# Altium footprint library PCB Library.PcbLib: 32 footprints (part 2 of 2)
Each footprint in its own frame and in the unit in brackets; x right, y up, seen from the top. Pads: shape width x height; smd on the part's side, far side on the other; paste and mask are expansions set on the pad; w line width, h text height; cw(c..) or ccw(c..) is an arc to the next point about the centre after c.
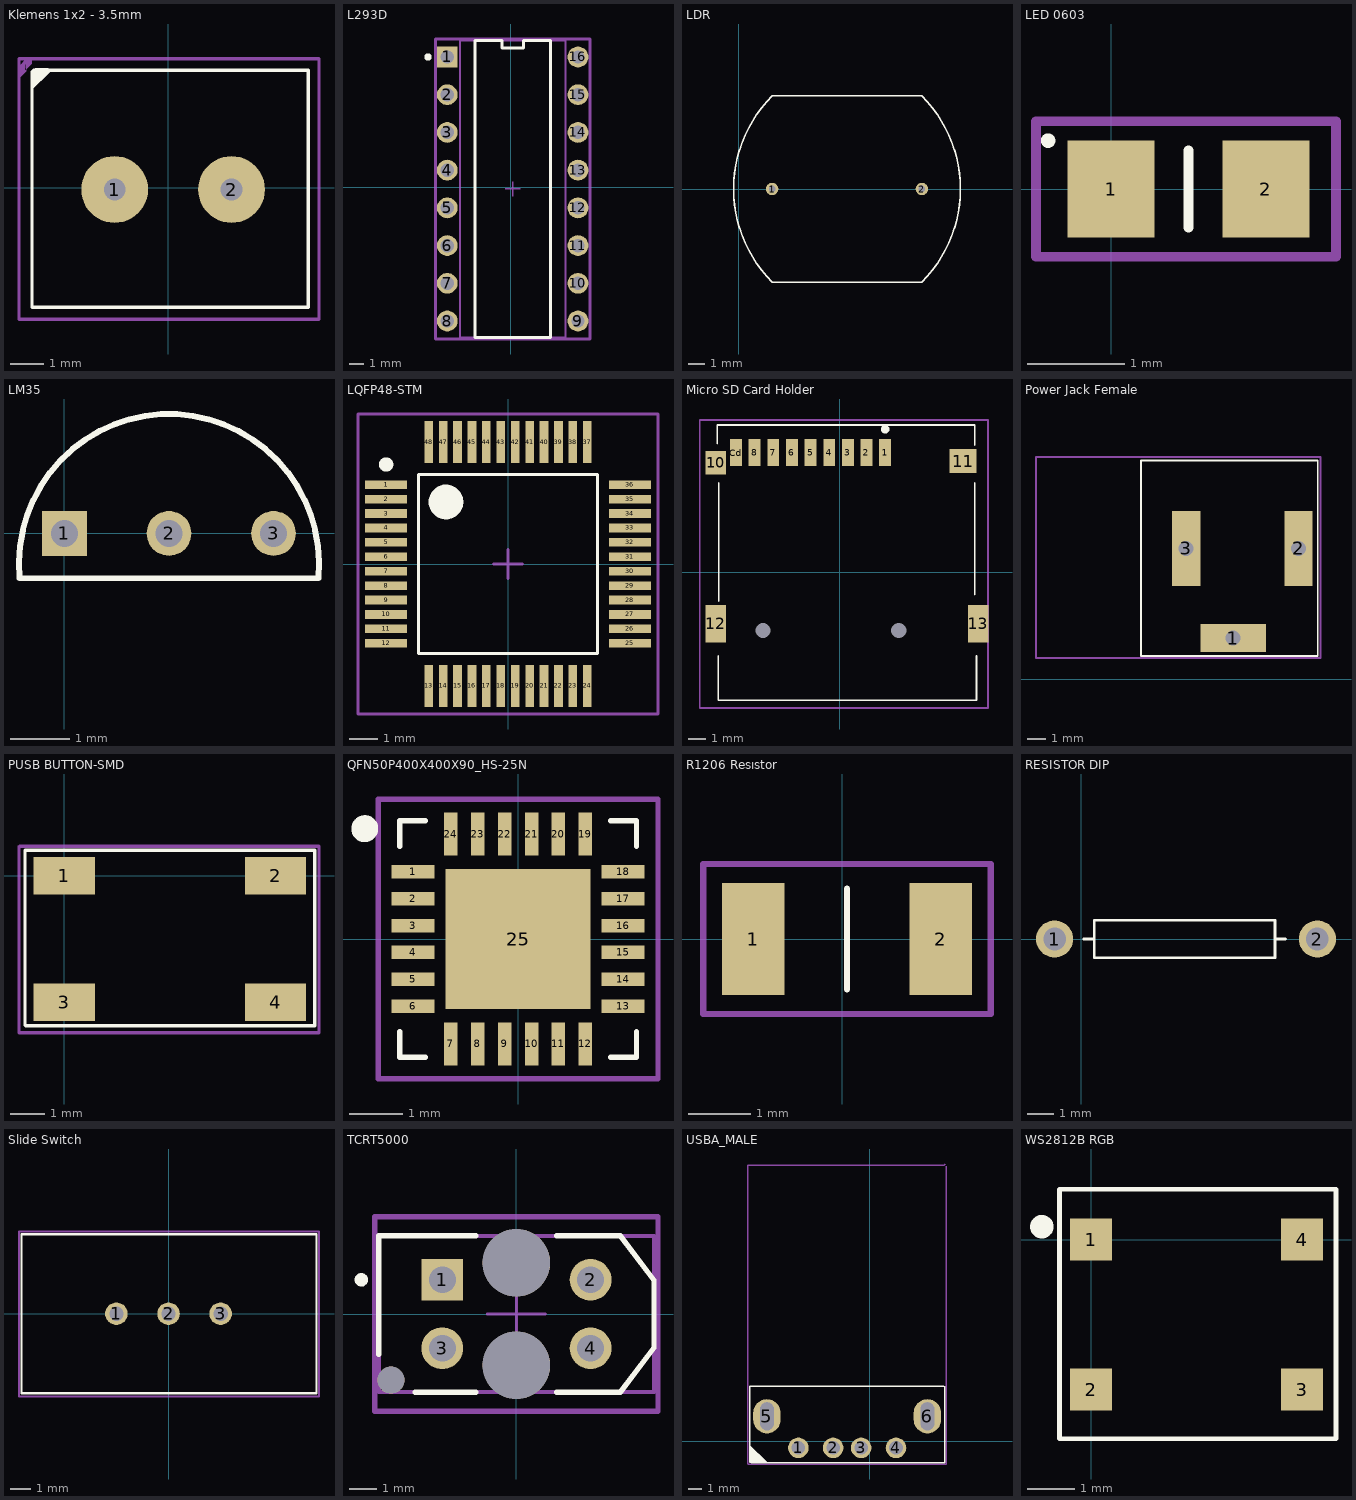
[diagram p1: the footprints below, top view; thin cyan lines are the x and y axes]

## Klemens 1x2 - 3.5mm [mm]
pads (2):
  round 2 hole 0.65: 1(-1.6,-0.05) 2(1.9,-0.05)
Top Overlay:
  region: -3.533,3.482 -4.106,2.909 -4.106,3.444 -3.972,3.577 -3.593,3.577
  lines w0.1: -4.075,3.475 -4.075,-3.575 4.2,-3.575 4.2,3.525 -4.025,3.525
Mechanical 3:
  region: -4.248,3.86 -4.464,3.644 -4.464,3.861 -4.462,3.86 -4.248,3.86 -4.248,3.496 -4.462,3.282 -4.462,3.86 -4.248,3.86 -4.241,3.853 -4.082,3.853 -4.082,3.709 -4.285,3.507
  lines w0.1: -4.462,-3.922 -4.462,3.86 -4.248,3.86 4.517,3.86 4.517,-3.931 -4.453,-3.931 -4.462,-3.922
3D body "terminal_blocks_a-tb350-te02.stp": height 8.9, standoff -3.29, extent -3.9,-3.45 4.094,3.55

## L293D [mm] "L293D Motor Driver"
pads (16):
  rect 1.4x1.4 hole 0.9 paste-1000 mask+0: 1(-4.256,8.78)
  round 1.4 hole 0.9 paste-1000 mask+0: 2(-4.256,6.24) 3(-4.256,3.7) 4(-4.256,1.16) 5(-4.256,-1.38) 6(-4.256,-3.92) 7(-4.256,-6.46) 8(-4.256,-9) 9(4.544,-9) 10(4.544,-6.46) 11(4.544,-3.92) 12(4.544,-1.38) 13(4.544,1.16) 14(4.544,3.7) 15(4.544,6.24) 16(4.544,8.78)
Top Overlay:
  circle w0.25: c-5.556,8.78 r0.125
  lines w0.2: -2.406,-10.11 2.694,-10.11 2.694,9.89 0.873,9.89 0.873,9.39 -0.585,9.39 -0.585,9.89 -2.406,9.89 -2.406,-10.11
Mechanical 3:
  lines w0.2: -5.056,-10.21 5.344,-10.21 5.344,9.99 -5.056,9.99 -5.056,-10.21
Mechanical 10:
  lines w0.2: -5.056,-10.21 -5.056,9.99 5.344,9.99 5.344,-10.21 -5.056,-10.21
Mechanical 12:
  lines w0.15: -3.406,-10.11 -3.406,9.89 3.694,9.89 3.694,-10.11 -3.406,-10.11
Mechanical 15:
  lines w0.1: -0.356,-0.11 0.644,-0.11 ; 0.144,-0.61 0.144,0.39
3D body "l293d.stp": height 6.82, standoff -1.56, extent -4.392,-9.856 4.842,9.575

## LDR [mm]
pads (2):
  round 0.75 hole 0.4 mask+0.051: 1(2,0) 2(11,0)
Top Overlay:
  lines w0.1: 2,-5.6 cw(c7.6,0) 2,5.6 11,5.6 cw(c5.4,0) 11,-5.6 2,-5.6
3D body "User Library-LDR12mm.step": height 3.7, standoff -4, extent 0.5,-5.467 12.5,5.452

## LED 0603 [mm]
pads (2):
  rect 0.9x1 smd: 1(0,0) 2(1.6,0)
Top Overlay:
  circle w0.1: c-0.65,0.5 r0.025
  lines w0.1: 0.8,-0.4 0.8,0.4
Mechanical 3:
  lines w0.1: -0.775,-0.7 -0.775,0.7 2.325,0.7 2.325,-0.7 -0.775,-0.7
3D body "ALSRobot-LED0603(G).step": height 0.6, standoff 0, extent -0.11,-0.4 1.51,0.4

## LM35 [mm] "LM35 Sıcaklık Sensörü"
pads (3):
  rect 0.75x0.75 hole 0.45 mask+0.051: 1(0,0)
  round 0.75 hole 0.45 mask+0.051: 2(1.75,0) 3(3.5,0)
Top Overlay:
  lines w0.1: -0.75,-0.75 cw(c1.75,-0.511) 4.25,-0.75 -0.75,-0.75
3D body "sensor_tsic501fto92.stp": height 3, standoff -14.3, extent -0.535,-0.75 4.035,1.55

## LQFP48-STM [mm] "TSQFP, 48-Leads, Body 7,00x7,00mm, Pitch 0,50mm, IPC Medium Density"
height 1.6
pads (48):
  rect 1.45x0.3 smd mask+0.05: 1(-4.225,2.75) 2(-4.225,2.25) 3(-4.225,1.75) 4(-4.225,1.25) 5(-4.225,0.75) 6(-4.225,0.25) 7(-4.225,-0.25) 8(-4.225,-0.75) 9(-4.225,-1.25) 10(-4.225,-1.75) 11(-4.225,-2.25) 12(-4.225,-2.75) 25(4.225,-2.75) 26(4.225,-2.25) 27(4.225,-1.75) 28(4.225,-1.25) 29(4.225,-0.75) 30(4.225,-0.25) 31(4.225,0.25) 32(4.225,0.75) 33(4.225,1.25) 34(4.225,1.75) 35(4.225,2.25) 36(4.225,2.75)
  rect 0.3x1.45 smd mask+0.05: 13(-2.75,-4.225) 14(-2.25,-4.225) 15(-1.75,-4.225) 16(-1.25,-4.225) 17(-0.75,-4.225) 18(-0.25,-4.225) 19(0.25,-4.225) 20(0.75,-4.225) 21(1.25,-4.225) 22(1.75,-4.225) 23(2.25,-4.225) 24(2.75,-4.225) 37(2.75,4.225) 38(2.25,4.225) 39(1.75,4.225) 40(1.25,4.225) 41(0.75,4.225) 42(0.25,4.225) 43(-0.25,4.225) 44(-0.75,4.225) 45(-1.25,4.225) 46(-1.75,4.225) 47(-2.25,4.225) 48(-2.75,4.225)
Top Overlay:
  circle w0.25: c-4.225,3.45 r0.125
  circle w0.6: c-2.15,2.15 r0.3
  lines w0.1: -3.1,-3.1 -3.1,3.1 3.1,3.1 3.1,-3.1 -3.1,-3.1
Mechanical 3:
  lines w0.1: -0.5,0 0.5,0 ; 0,-0.5 0,0.5 ; -5.2,-5.2 -5.2,5.2 5.2,5.2 5.2,-5.2 -5.2,-5.2
3D body "LQFP48-STM.step": height 1.6, standoff 0, extent -4.5,-4.5 4.5,4.5

## Micro SD Card Holder [mm]
pads (15):
  rect 0.7x1.6 smd paste+0 mask+0: 1(2.684,7.075) 2(1.584,7.075) 3(0.484,7.075) 4(-0.616,7.075) 5(-1.716,7.075) 6(-2.816,7.075) 7(-3.916,7.075) 8(-5.016,7.075) Cd(-6.116,7.075)
  rect 1.2x1.4 smd paste+0 mask+0: 10(-7.316,6.475)
  rect 1.6x1.4 smd paste+0 mask+0: 11(7.284,6.575)
  rect 1.2x2.2 smd paste+0 mask+0: 12(-7.316,-3.025) 13(8.184,-3.025)
  round 0 hole 0.9 unplated paste-1000 mask+0: ""(-4.516,-3.425) ""(3.484,-3.425)
Top Overlay:
  circle w0.25: c2.684,8.45 r0.125
  lines w0.1: -7.225,7.6 -7.225,8.7 7.975,8.7 7.975,7.5 ; -7.157,-4.925 -7.157,-7.548 8.075,-7.548 8.075,-4.925 ; -7.125,-1.7 -7.125,5.3 ; 7.975,-1.3 7.975,5.3
Mechanical 3:
  lines w0.1: -8.25,-8 -8.25,9 -7.75,9 8.5,9 8.75,9 8.75,-8 -8.25,-8
3D body "User Library-MEM2055-00-190-01-A_revG.step": height 1.85, standoff -0.6, extent -7.567,-7.42 8.433,7.83

## Power Jack Female [mm]
pads (3):
  rect 3.5x1.5 hole 0.8 square mask+0.051: 1(-11.5,2.2)
  rect 1.5x4 hole 0.8 square mask+0.051: 2(-8,7) 3(-14,7)
Top Overlay:
  lines w0.1: -16.425,1.25 -6.975,1.25 -6.975,11.7 -16.425,11.7 -16.425,1.25
Mechanical 3:
  lines w0.1: -6.825,1.15 -6.975,1.15 -22.025,1.15 -22.025,11.875 -6.925,11.875 -6.825,11.875 -6.825,1.2
3D body "dc-005-5a-20.stp": height 11.5, standoff -3.1, extent -21.9,1.85 -7.9,11.25

## PUSB BUTTON-SMD [mm]
pads (4):
  rect 1.8x1.1 smd mask+0.05: 1(0,0) 2(6.2,0) 3(0,-3.7) 4(6.2,-3.7)
Top Overlay:
  lines w0.1: -1.15,-4.375 -1.15,0.75 7.35,0.75 7.35,-4.4 -1.125,-4.4
Mechanical 3:
  lines w0.1: -1.325,-4.6 -1.325,0.85 -1.3,0.875 7.475,0.875 7.475,-4.6 -1.325,-4.6
3D body "User Library-4x4_SMD_Switch.step": height 1.5, standoff 0, extent -0.2,-4.5 6.2,0.7

## QFN50P400X400X90_HS-25N [mm] "QFN, 24-Leads, Body 4,00x4,00mm, Pitch 0,50mm, Thermal Pad 2,70x2,60mm, IPC Medium Density"
height 0.9
pads (25):
  rect 0.8x0.25 smd mask+0.05: 1(-1.95,1.25) 2(-1.95,0.75) 3(-1.95,0.25) 4(-1.95,-0.25) 5(-1.95,-0.75) 6(-1.95,-1.25) 13(1.95,-1.25) 14(1.95,-0.75) 15(1.95,-0.25) 16(1.95,0.25) 17(1.95,0.75) 18(1.95,1.25)
  rect 0.25x0.8 smd mask+0.05: 7(-1.25,-1.95) 8(-0.75,-1.95) 9(-0.25,-1.95) 10(0.25,-1.95) 11(0.75,-1.95) 12(1.25,-1.95) 19(1.25,1.95) 20(0.75,1.95) 21(0.25,1.95) 22(-0.25,1.95) 23(-0.75,1.95) 24(-1.25,1.95)
  rect 2.7x2.6 smd mask+0.05: 25(0,0)
Top Overlay:
  circle w0.25: c-2.85,2.05 r0.125
  lines w0.1: -2.2,-1.725 -2.2,-2.2 -1.725,-2.2 ; -2.2,1.725 -2.2,2.2 -1.725,2.2 ; 1.725,-2.2 2.2,-2.2 2.2,-1.725 ; 1.725,2.2 2.2,2.2 2.2,1.725
Mechanical 3:
  lines w0.1: -0.5,0 0.5,0 ; 0,-0.5 0,0.5 ; -2.6,-2.6 2.6,-2.6 2.6,2.6 -2.6,2.6 -2.6,-2.6
3D body "QFN50P400X400X90_HS-25N.step": height 0.9, standoff 0, extent -2.07,-2.07 2.07,2.07

## R1206 Resıstor [mm]
pads (2):
  rect 1x1.8 smd mask+0.05: 1(-1.425,0) 2(1.575,0)
Top Overlay:
  lines w0.1: 0.075,-0.805 0.075,0.805
Mechanical 3:
  lines w0.1: -2.225,-1.2 2.375,-1.2 2.375,1.2 -2.225,1.2 -2.225,-1.2
3D body "1206RES.step": height 0.55, standoff 0, extent -1.525,-0.805 1.675,0.805

## RESISTOR DIP [mm]
pads (2):
  round 1.4 hole 0.85 mask+0.051: 1(-1,0) 2(8.9,0)
Top Overlay:
  lines w0.1: 0.1,0 0.5,0 ; 7.3,0 7.7,0 ; 0.5,0 0.5,0.7 2.45,0.7 5.15,0.7 7.3,0.7 7.3,-0.7 5.15,-0.7 2.45,-0.7 0.5,-0.7 0.5,0
3D body "User Library-MF0_25W_6mm_10mm_22ohm.step": height 2.5, standoff -1.6, extent -1.225,-1.1 9.225,0.9

## Slide Switch [mm]
pads (3):
  round 1.1 hole 0.7 mask+0.051: 1(-2.54,0) 2(0,0) 3(2.54,0)
Top Overlay:
  lines w0.1: -7.165,-3.875 7.21,-3.875 7.21,3.875 -7.165,3.875 -7.165,-3.875
Mechanical 3:
  lines w0.1: -7.29,-4.025 7.335,-4.025 7.335,4 -7.29,4 -7.29,-4.025
3D body "22205.stp": height 10.65, standoff -4.09, extent -7.07,-3.75 7.05,3.75

## TCRT5000 [mm] "TCRT5000 Kızıl Ötesi Sensör"
pads (7):
  rect 1.55x1.55 hole 1 paste-1000 mask+0: 1(-2.75,1.27)
  round 1.55 hole 1 paste-1000 mask+0: 2(2.75,1.27) 3(-2.75,-1.27) 4(2.75,-1.27)
  round 1 hole 1 unplated paste-1000 mask+0: ""(-4.65,-2.45)
  round 2.5 hole 2.5 unplated paste-1000 mask+0: ""(0,-1.9) ""(0,1.9)
Top Overlay:
  circle w0.25: c-5.75,1.27 r0.125
  lines w0.2: -5.1,-1.5 -5.1,2.9 -1.5,2.9 ; -3.75,-2.9 -1.5,-2.9 ; 1.5,-2.9 3.85,-2.9 5.1,-1.25 5.1,1.25 3.85,2.9 1.5,2.9
Mechanical 10:
  lines w0.2: -5.25,-3.6 -5.25,3.6 5.25,3.6 5.25,-3.6 -5.25,-3.6
Mechanical 12:
  lines w0.15: -5.1,-2.9 -5.1,2.9 5.1,2.9 5.1,-2.9 -5.1,-2.9
Mechanical 15:
  lines w0.1: -1.08,0 1.08,0 ; 0,-1.08 0,1.08
  lines w0.2: -5.25,-3.6 -5.25,3.6 5.25,3.6 5.25,-3.6 -5.25,-3.6
3D body "3dmodel.step": height 0.25, standoff 0, extent -5.25,-3.6 5.25,3.6

## USBA_MALE [mm]
pads (6):
  round 1.5 hole 1 mask+0.05: 1(-5.21,-0.5) 2(-2.67,-0.5) 3(-0.63,-0.5) 4(1.91,-0.5)
  oval 2x2.5 hole 1 slot 2.05 at 90 deg paste+0: 5(-7.5,1.8) 6(4.2,1.8)
Top Overlay:
  region: -8.775,-0.275 -7.525,-1.525 -8.775,-1.525
  lines w0.1: -8.675,-1.55 -8.75,-1.55 -8.75,-1.4 -8.75,2.5 -8.75,4 5.375,4 ; -8.65,-1.575 5.45,-1.575 5.45,4
Mechanical 3:
  lines w0.1: 5.5,20.2 5.4,20.1 -8.9,20.1 -8.9,-1.5 -8.9,-1.675 -8.775,-1.675 5.575,-1.675 5.575,20.025
3D body "usb_a-usb_a-lp-c.stp": height 4.5, standoff -1.3, extent -7.953,-0.55 4.653,19.375

## WS2812B RGB [mm] "WS2812B RGB LED"
pads (4):
  rect 0.9x0.9 smd mask+0.051: 1(0,0) 2(0,-3.2) 3(4.5,-3.2) 4(4.5,0)
Top Overlay:
  circle w0.25: c-1.05,0.275 r0.125
  lines w0.1: -0.675,-4.25 5.225,-4.25 5.225,1.075 -0.675,1.075 -0.675,-4.25
3D body "User Library-WS2812B.step": height 1.5, standoff -0.2, extent -0.5,-4.1 4.9,0.9